# Altium footprint library PcbLib1.PcbLib: 1009 footprints (part 20 of 64)
Each footprint in its own frame and in the unit in brackets; x right, y up, seen from the top. Pads: shape width x height; smd on the part's side, far side on the other; paste and mask are expansions set on the pad; w line width, h text height; cw(c..) or ccw(c..) is an arc to the next point about the centre after c.
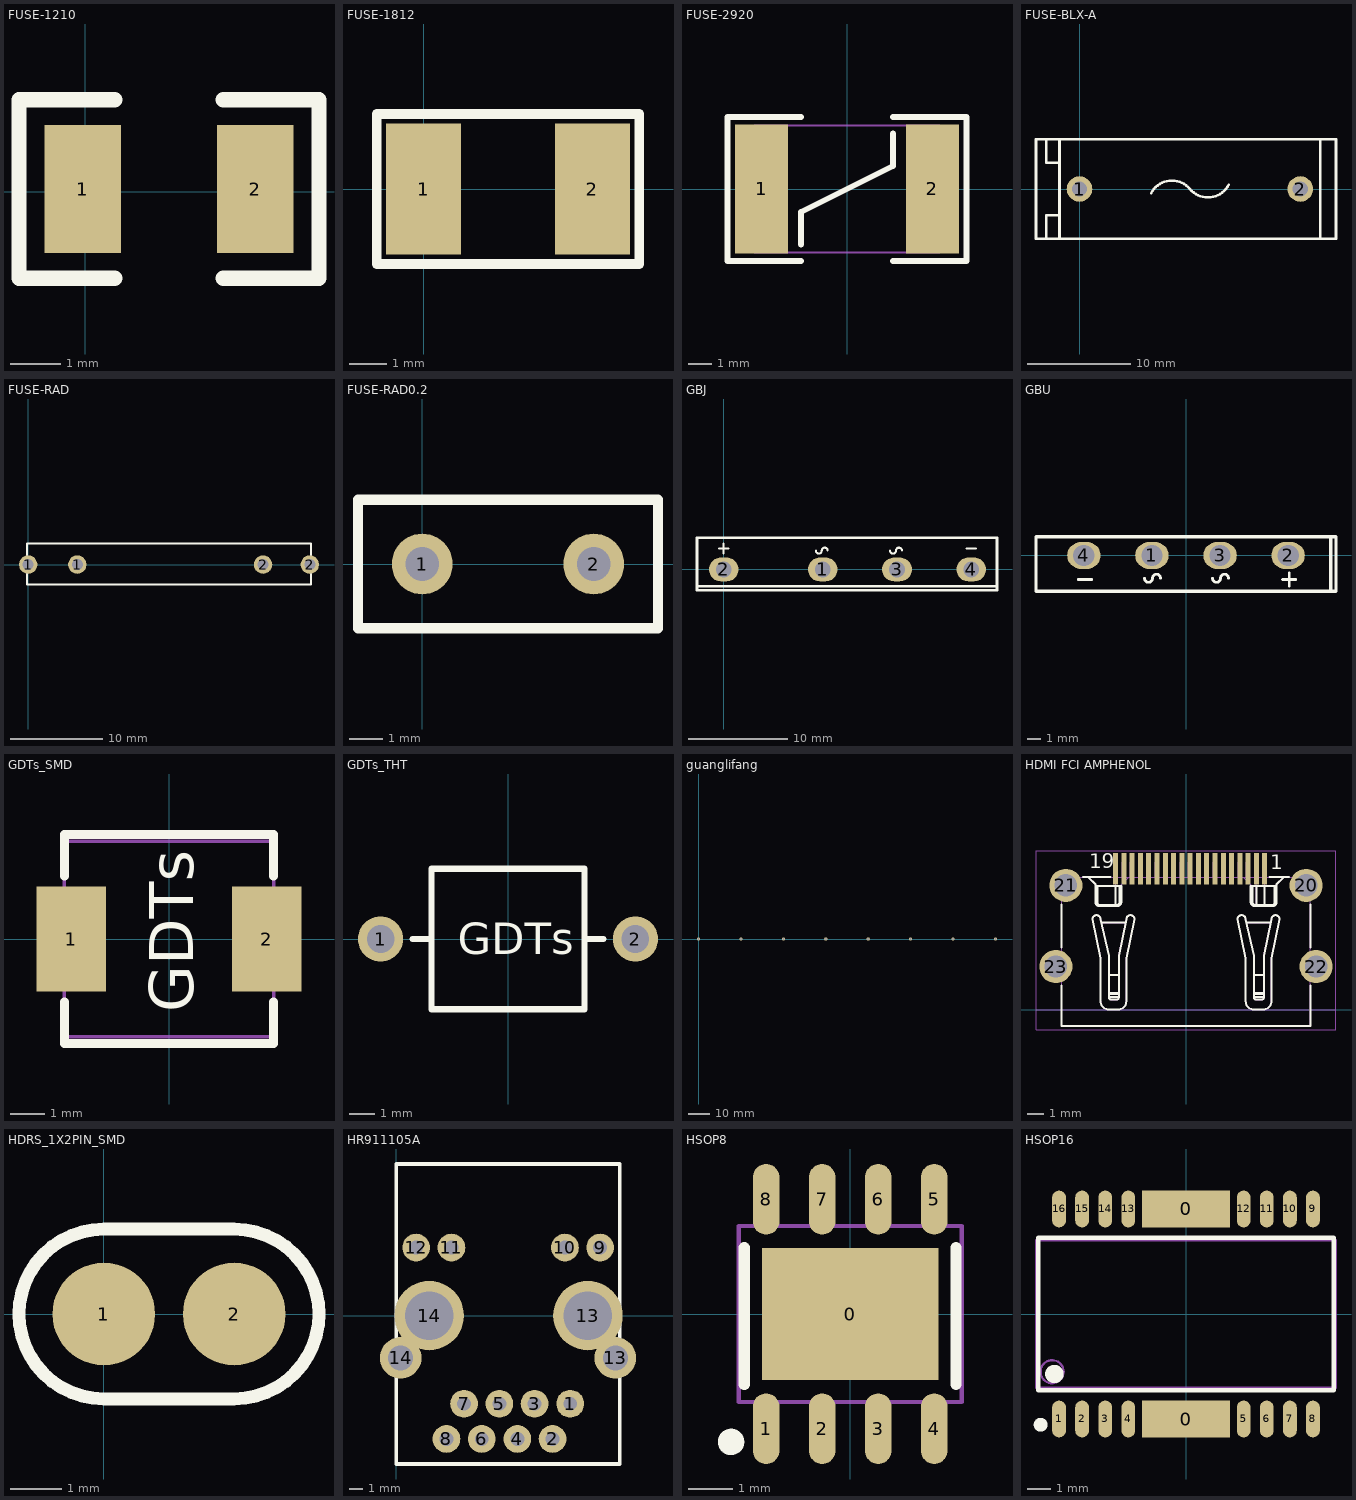
[diagram p19: the footprints below, top view; thin cyan lines are the x and y axes]

## FUSE-1210 [mil]
pads (2):
  rect 60x100 smd: 1(-2,2) 2(133,2)
Top Overlay:
  lines w12: 23,-68 -52,-68 -52,72 23,72 ; 108,-68 183,-68 183,72 108,72
3D body "Fuse1210.STEP": height 26.57, standoff 0, extent 7.72,-48.69 134.29,52.69

## FUSE-1812 [mm]
pads (2):
  rect 2x3.5 smd: 1(0,0) 2(4.5,0)
Top Overlay:
  lines w0.254: -1.25,-2 -1.25,2 5.75,2 5.75,-2 -1.25,-2
3D body "User Library-fuse1812.STEP": height 1.32, standoff 0, extent -0.16,-1.61 4.66,1.61

## FUSE-2920 [mm]
pads (2):
  rect 2.3x5.6 smd: 1(-3.7,0) 2(3.7,0)
Top Overlay:
  lines w0.254: -2,-3.125 -5.175,-3.125 -5.175,3.125 -2,3.125 ; -2,-2.4 -2,-1 2,1 2,2.4 ; 2,-3.125 5.175,-3.125 5.175,3.125 2,3.125
Mechanical 13:
  lines w0.1: -4,-2.75 -4,2.75 4,2.75 4,-2.75 -4,-2.75
3D body "User Library-FUSE-2920.STEP": height 1, standoff 0, extent -3.901,-2.65 3.799,2.65

## FUSE-BLX-A [mm]
pads (2):
  round 2.5 hole 1.5: 1(0,0) 2(21.5,0)
Top Overlay:
  lines w0.254: -1.95,-4.826 -1.95,-2.54 ; -1.95,4.826 -1.95,2.54 ; 6.968,-0.419 cw(c8.999,-1.469) 10.75,0 ccw(c12.501,1.469) 14.532,0.419 ; 23.196,-4.826 24.974,-4.826 24.974,4.826 23.45,4.826 ; -3.22,-4.826 -3.22,-2.54 -1.95,-2.54 ; -3.22,-4.826 23.45,-4.826 23.45,4.826 ; -3.22,-4.826 -4.236,-4.826 -4.236,4.826 -3.22,4.826 ; -3.22,4.826 -3.22,2.54 -1.95,2.54 ; -3.22,4.826 23.45,4.826 ; -1.95,-2.54 -1.95,2.54
3D body "3.STEP": height 13.9, standoff -3.6, extent -4.261,-4.801 25.089,4.699

## FUSE-RAD [mm]
pads (4):
  round 2 hole 1.2: 1(0,0) 1(5.334,0) 2(25.527,0) 2(30.607,0)
Top Overlay:
  lines w0.254: -0.127,-2.159 30.734,-2.159 30.734,2.286 -0.127,2.286 -0.127,-2.159
3D body "SW3DPS-FUSE-DEFAULT.STEP": height 8.84, standoff -4.01, extent -0.127,-2.825 30.753,3.079

## FUSE-RAD0.2 [mm]
pads (2):
  round 1.8 hole 1: 1(0,0) 2(5.08,0)
Top Overlay:
  lines w0.305: -1.905,-1.905 -1.905,1.905 6.985,1.905 6.985,-1.905 -1.905,-1.905
3D body "FUSE-FRU110-30F.STEP": height 11, standoff -7.22, extent -1.16,-0.85 6.24,0.85

## GBJ [mm]
pads (4):
  oval 3x2.4 hole 1.6: 1(10,0) 2(0,0) 3(17.5,0) 4(25,0)
Top Overlay:
  lines w0.203: -0.5,2.1 0.5,2.1 ; 0,1.6 0,2.6 ; 9.3,1.9 ccw(c9.6,1.9) 9.9,1.9 cw(c10.2,1.9) 10.5,1.9 ; 16.8,1.9 ccw(c17.1,1.9) 17.4,1.9 cw(c17.7,1.9) 18,1.9 ; 24.5,2.1 25.5,2.1
  lines w0.254: -2.7,-1.7 27.6,-1.7 ; -2.7,-2.1 -2.7,3.2 27.6,3.2 27.6,-2.1 -2.7,-2.1

## GBU [mm]
pads (4):
  oval 2.5x2 hole 1.6: 1(-2.54,0) 2(7.62,0) 3(2.54,0) 4(-7.62,0)
Top Overlay:
  lines w0.203: -8.04,-1.8 -7.04,-1.8 ; -3.1,-1.7 ccw(c-2.8,-1.7) -2.5,-1.7 cw(c-2.2,-1.7) -1.9,-1.7 ; 1.98,-1.7 ccw(c2.28,-1.7) 2.58,-1.7 cw(c2.88,-1.7) 3.18,-1.7 ; 7.2,-1.8 8.2,-1.8 ; 7.7,-2.3 7.7,-1.3
  lines w0.254: 10.8,-2.67 10.8,1.3 ; -11.2,-2.67 11.2,-2.67 11.2,1.4 -11.2,1.4 -11.2,-2.67

## GDTs_SMD [mm]
pads (2):
  rect 2x3 smd: 1(-2.8,0) 2(2.8,0)
Top Overlay:
  lines w0.254: -3,-1.8 -3,-3 3,-3 3,-1.8 ; -3,1.8 -3,3 3,3 3,1.8
  text "GDTs" at 0.7,-2.1 h1.27
Mechanical 13:
  lines w0.1: -3,-2.8 3,-2.8 3,2.8 -3,2.8 -3,-2.8

## GDTs_THT [mm]
pads (2):
  round 1.8 hole 1.1: 1(-5.08,0) 2(5.08,0)
Top Overlay:
  lines w0.254: -3.8,0 -3.048,0 ; 3.048,0 3.8,0 ; -3.048,-2.794 3.048,-2.794 3.048,2.794 -3.048,2.794 -3.048,-2.794
  text "GDTs" at -2,-0.6 h1.27

## guanglifang [mm]
pads (8):
  round 1.5 hole 0.9: 1(0,0) 2(20,0) 3(40,0) 4(60,0) 5(80,0) 6(100,0) 7(120,0) 8(140,0)

## HDMI FCI AMPHENOL [mm]
pads (23):
  rect 0.3x1.9 smd mask+0.05: 1(4.75,8.5) 2(4.25,8.5) 3(3.75,8.5) 4(3.25,8.5) 5(2.75,8.5) 6(2.25,8.5) 7(1.75,8.5) 8(1.25,8.5) 9(0.75,8.5) 10(0.25,8.5) 11(-0.25,8.5) 12(-0.75,8.5) 13(-1.25,8.5) 14(-1.75,8.5) 15(-2.25,8.5) 16(-2.75,8.5) 17(-3.25,8.5) 18(-3.75,8.5) 19(-4.25,8.5)
  round 2 hole 1.35 mask+0.1: 20(7.25,7.5) 21(-7.25,7.5) 22(7.85,2.6) 23(-7.85,2.6)
Top Overlay:
  lines w0.12: -7.5,1.45 -7.5,-1 7.5,-1 7.5,1.45 ; -7.5,3.75 -7.5,6.35 ; -6.2,8 -4.55,8 ; -5.9,8 -5.45,7.55 -5.45,6.45 ccw(c-5.25,6.45) -5.25,6.25 -4.15,6.25 ccw(c-4.15,6.5) -3.9,6.5 -3.9,7.45 -5.45,7.45 ; -5.35,7.45 -5.35,6.5 -5.35,6.45 ccw(c-5.2,6.45) -5.2,6.3 -4.2,6.3 ccw(c-4.2,6.5) -4,6.5 -4,7.45 ; -5.1,5.25 -3.65,5.25 ; -4.65,0.95 -4.05,0.95 ; -4.65,1 -4.05,1 ; -4.65,2.1 -4.05,2.1 ; -4.25,6.3 -4.25,7.45 ; 3.65,5.25 5.1,5.25 ; 4,7.45 4,6.5 ccw(c4.2,6.5) 4.2,6.3 5.2,6.3 ccw(c5.2,6.45) 5.35,6.45 5.35,6.5 5.35,7.45 ; 4.1,0.95 4.7,0.95 ; 4.1,1 4.7,1 ; 4.1,2.1 4.7,2.1 ; 4.25,6.3 4.25,7.45 ; 4.75,6.3 4.75,7.45 ; 5.05,8 6.2,8 ; 5.45,7.45 3.9,7.45 3.9,6.5 ccw(c4.15,6.5) 4.15,6.25 5.25,6.25 ccw(c5.25,6.45) 5.45,6.45 5.45,7.55 5.9,8 ; 7.5,3.75 7.5,6.35 ; -5.4,5.7 ccw(c-5.4,5.45) -5.65,5.45 -5.15,3.1 -5.15,0.5 ccw(c-4.65,0.5) -4.65,0 -4.6,0 -4.1,0 ccw(c-4.1,0.5) -3.6,0.5 -3.6,3.1 -3.1,5.45 ccw(c-3.35,5.45) -3.35,5.7 ccw(c-3.35,5.45) -3.6,5.45 -4.05,3.25 -4.05,0.75 ; -5.4,5.7 cw(c-5.4,5.45) -5.15,5.45 -4.65,3.25 -4.65,0.85 -4.65,0.75 ; -5.4,5.7 -5.4,5.7 ; -4.65,0.75 ccw(c-4.5,0.75) -4.5,0.6 -4.2,0.6 ccw(c-4.2,0.75) -4.05,0.75 ; -4.65,0.75 -4.05,0.75 ; 3.35,5.7 cw(c3.35,5.45) 3.6,5.45 4.1,3.25 4.1,0.85 4.1,0.75 ; 3.35,5.7 ccw(c3.35,5.45) 3.1,5.45 3.6,3.1 3.6,0.5 ccw(c4.1,0.5) 4.1,0 4.15,0 4.65,0 ccw(c4.65,0.5) 5.15,0.5 5.15,3.1 5.65,5.45 ccw(c5.4,5.45) 5.4,5.7 ccw(c5.4,5.45) 5.15,5.45 4.7,3.25 4.7,0.75 ; 3.35,5.7 3.35,5.7 ; 4.1,0.75 ccw(c4.25,0.75) 4.25,0.6 4.55,0.6 ccw(c4.55,0.75) 4.7,0.75 ; 4.1,0.75 4.7,0.75
  text "1" at 5.075,8.175 h1.5
  text "19" at -5.85,8.225 h1.5
Mechanical 7:
  lines w0.01: -9,0 9,0
  text "PCB" at -9.4,-0.8 h1
  text "EDGE" at 7.775,-0.775 h1
Mechanical 14:
  lines w0.01: -7.5,2.1 -8.2,2.1 -8.2,3.1 -7.5,3.1 ; -5.9,8 -5.45,7.55 -5.45,6.45 ccw(c-5.25,6.45) -5.25,6.25 -4.15,6.25 ccw(c-4.15,6.5) -3.9,6.5 -3.9,7.55 -3.45,8 ; -5.45,7.45 -3.9,7.45 ; -5.35,7.45 -5.35,6.5 -5.35,6.45 ccw(c-5.2,6.45) -5.2,6.3 -4.2,6.3 ccw(c-4.2,6.5) -4,6.5 -4,7.45 ; -5.1,5.25 -3.65,5.25 ; -4.65,0.95 -4.05,0.95 ; -4.65,1 -4.05,1 ; -4.65,2.1 -4.05,2.1 ; -4.35,8 -4.35,8.9 -4.15,8.9 -4.15,8 ; -4.25,6.3 -4.25,8 ; -3.85,8 -3.85,8.9 -3.65,8.9 -3.65,8 ; -3.35,8 -3.35,8.9 -3.15,8.9 -3.15,8 ; -2.85,8 -2.85,8.9 -2.65,8.9 -2.65,8 ; -2.35,8 -2.35,8.9 -2.15,8.9 -2.15,8 ; -1.85,8 -1.85,8.9 -1.65,8.9 -1.65,8 ; -1.35,8 -1.35,8.9 -1.15,8.9 -1.15,8 ; -0.85,8 -0.85,8.9 -0.65,8.9 -0.65,8 ; -0.35,8 -0.35,8.9 -0.15,8.9 -0.15,8 ; 0.15,8 0.15,8.9 0.35,8.9 0.35,8 ; 0.65,8 0.65,8.9 0.85,8.9 0.85,8 ; 1.15,8 1.15,8.9 1.35,8.9 1.35,8 ; 1.65,8 1.65,8.9 1.85,8.9 1.85,8 ; 2.15,8 2.15,8.9 2.35,8.9 2.35,8 ; 2.65,8 2.65,8.9 2.85,8.9 2.85,8 ; 3.15,8 3.15,8.9 3.35,8.9 3.35,8 ; 3.45,8 3.9,7.55 3.9,6.5 ccw(c4.15,6.5) 4.15,6.25 5.25,6.25 ccw(c5.25,6.45) 5.45,6.45 5.45,7.55 5.9,8 ; 3.65,5.25 5.1,5.25 ; 3.65,8 3.65,8.9 3.85,8.9 3.85,8 ; 3.9,7.45 5.45,7.45 ; 4,7.45 4,6.5 ccw(c4.2,6.5) 4.2,6.3 5.2,6.3 ccw(c5.2,6.45) 5.35,6.45 5.35,6.5 5.35,7.45 ; 4.1,0.95 4.7,0.95 ; 4.1,1 4.7,1 ; 4.1,2.1 4.7,2.1 ; 4.15,8 4.15,8.9 4.35,8.9 4.35,8 ; 4.25,6.3 4.25,8 ; 4.65,8 4.65,8.9 4.85,8.9 4.85,8 ; 4.75,6.3 4.75,8 ; 7.5,2.1 8.2,2.1 8.2,3.1 7.5,3.1 ; -5.4,5.7 cw(c-5.4,5.45) -5.15,5.45 -4.65,3.25 -4.65,0.85 -4.65,0.75 ; -5.4,5.7 ccw(c-5.4,5.45) -5.65,5.45 -5.15,3.1 -5.15,0.5 ccw(c-4.65,0.5) -4.65,0 -4.6,0 -4.1,0 ccw(c-4.1,0.5) -3.6,0.5 -3.6,3.1 -3.1,5.45 ccw(c-3.35,5.45) -3.35,5.7 ccw(c-3.35,5.45) -3.6,5.45 -4.05,3.25 -4.05,0.75 ; -5.4,5.7 -5.4,5.7 ; -4.65,0.75 ccw(c-4.5,0.75) -4.5,0.6 -4.2,0.6 ccw(c-4.2,0.75) -4.05,0.75 ; -4.65,0.75 -4.05,0.75 ; 3.35,5.7 ccw(c3.35,5.45) 3.1,5.45 3.6,3.1 3.6,0.5 ccw(c4.1,0.5) 4.1,0 4.15,0 4.65,0 ccw(c4.65,0.5) 5.15,0.5 5.15,3.1 5.65,5.45 ccw(c5.4,5.45) 5.4,5.7 ccw(c5.4,5.45) 5.15,5.45 4.7,3.25 4.7,0.75 ; 3.35,5.7 cw(c3.35,5.45) 3.6,5.45 4.1,3.25 4.1,0.85 4.1,0.75 ; 3.35,5.7 3.35,5.7 ; 4.1,0.75 ccw(c4.25,0.75) 4.25,0.6 4.55,0.6 ccw(c4.55,0.75) 4.7,0.75 ; 4.1,0.75 4.7,0.75 ; -7.5,-1 7.5,-1 7.5,8 -7.5,8 -7.5,-1
  text "'.Designator'" at -2,-0.5 h0.75
  text "19" at -5.85,8.225 h1.5
  text "1" at 5.075,8.175 h1.5
Mechanical 16:
  lines w0.01: -9.05,-1.2 -9.05,9.6 -4.25,9.6 9.05,9.6 9.05,-1.2 -9.05,-1.2
3D body "CON_FCI_10029449-001LF.STEP": height 6.08, standoff -1.92, extent -8.1,-1 8.1,8.9
3D body: height 6.3, standoff 0, extent -7.5,-1 7.5,8

## HDRS_1X2PIN_SMD [mm]
pads (2):
  round 2 smd mask+0.051: 1(0,0) 2(2.54,0)
Top Overlay:
  lines w0.254: 0,-1.651 cw(c0,0) 0,1.651 2.54,1.651 cw(c2.54,0) 2.54,-1.651 0,-1.651

## HR911105A [mm] "网络变压器"
pads (16):
  round 2 hole 1: 1(12.522,-6.35) 2(11.252,-8.89) 3(9.957,-6.35) 4(8.712,-8.89) 5(7.417,-6.35) 6(6.147,-8.89) 7(4.877,-6.35) 8(3.607,-8.89) 9(14.681,4.902) 10(12.141,4.902) 11(3.962,4.902) 12(1.422,4.902)
  round 5 hole 3.5: 13(13.792,0) 14(2.362,0)
  round 3 hole 1.8: 13(15.773,-3.048) 14(0.305,-3.048)
Top Overlay:
  lines w0.254: -0.025,-10.693 16.104,-10.693 16.104,10.922 -0.025,10.922 -0.025,-10.693
3D body "User Library-RMS-001L-08A0-GY.STEP": height 2.3, standoff -14.5, extent -0.025,-10.498 15.975,10.802

## HSOP8 [mm]
pads (9):
  rect 4x3 smd: 0(0,0)
  oval 0.6x1.6 smd: 1(-1.905,-2.6) 2(-0.635,-2.6) 3(0.635,-2.6) 4(1.905,-2.6) 5(1.905,2.6) 6(0.635,2.6) 7(-0.635,2.6) 8(-1.905,2.6)
Top Overlay:
  circle w0.3: c-2.7,-2.9 r0.15
  lines w0.254: -2.4,-1.6 -2.4,1.5 ; 2.4,-1.6 2.4,1.5
Mechanical 13:
  lines w0.1: -2.525,-1.995 -2.525,1.995 2.525,1.995 2.525,-1.995 -2.525,-1.995

## HSOP16 [mm]
pads (18):
  rect 3.8x1.6 smd: 0(0,-4.55) 0(0,4.55)
  oval 0.6x1.6 smd: 1(-5.5,-4.55) 2(-4.5,-4.55) 3(-3.5,-4.55) 4(-2.5,-4.55) 5(2.5,-4.55) 6(3.5,-4.55) 7(4.5,-4.55) 8(5.5,-4.55) 9(5.5,4.55) 10(4.5,4.55) 11(3.5,4.55) 12(2.5,4.55) 13(-2.5,4.55) 14(-3.5,4.55) 15(-4.5,4.55) 16(-5.5,4.55)
Top Overlay:
  circle w0.4: c-5.7,-2.6 r0.2
  circle w0.3: c-6.3,-4.8 r0.15
  lines w0.2: -6.4,-3.3 -6.4,3.3 6.4,3.3 6.4,-3.3 -6.4,-3.3
Mechanical 13:
  circle w0.1: c-5.8,-2.5 r0.5
  lines w0.1: -6.5,-3.2 -6.5,3.2 6.5,3.2 6.5,-3.2 -6.5,-3.2